# Altium footprint library IC.Pcblib: 91 footprints (part 5 of 6)
Each footprint in its own frame and in the unit in brackets; x right, y up, seen from the top. Pads: shape width x height; smd on the part's side, far side on the other; paste and mask are expansions set on the pad; w line width, h text height; cw(c..) or ccw(c..) is an arc to the next point about the centre after c.
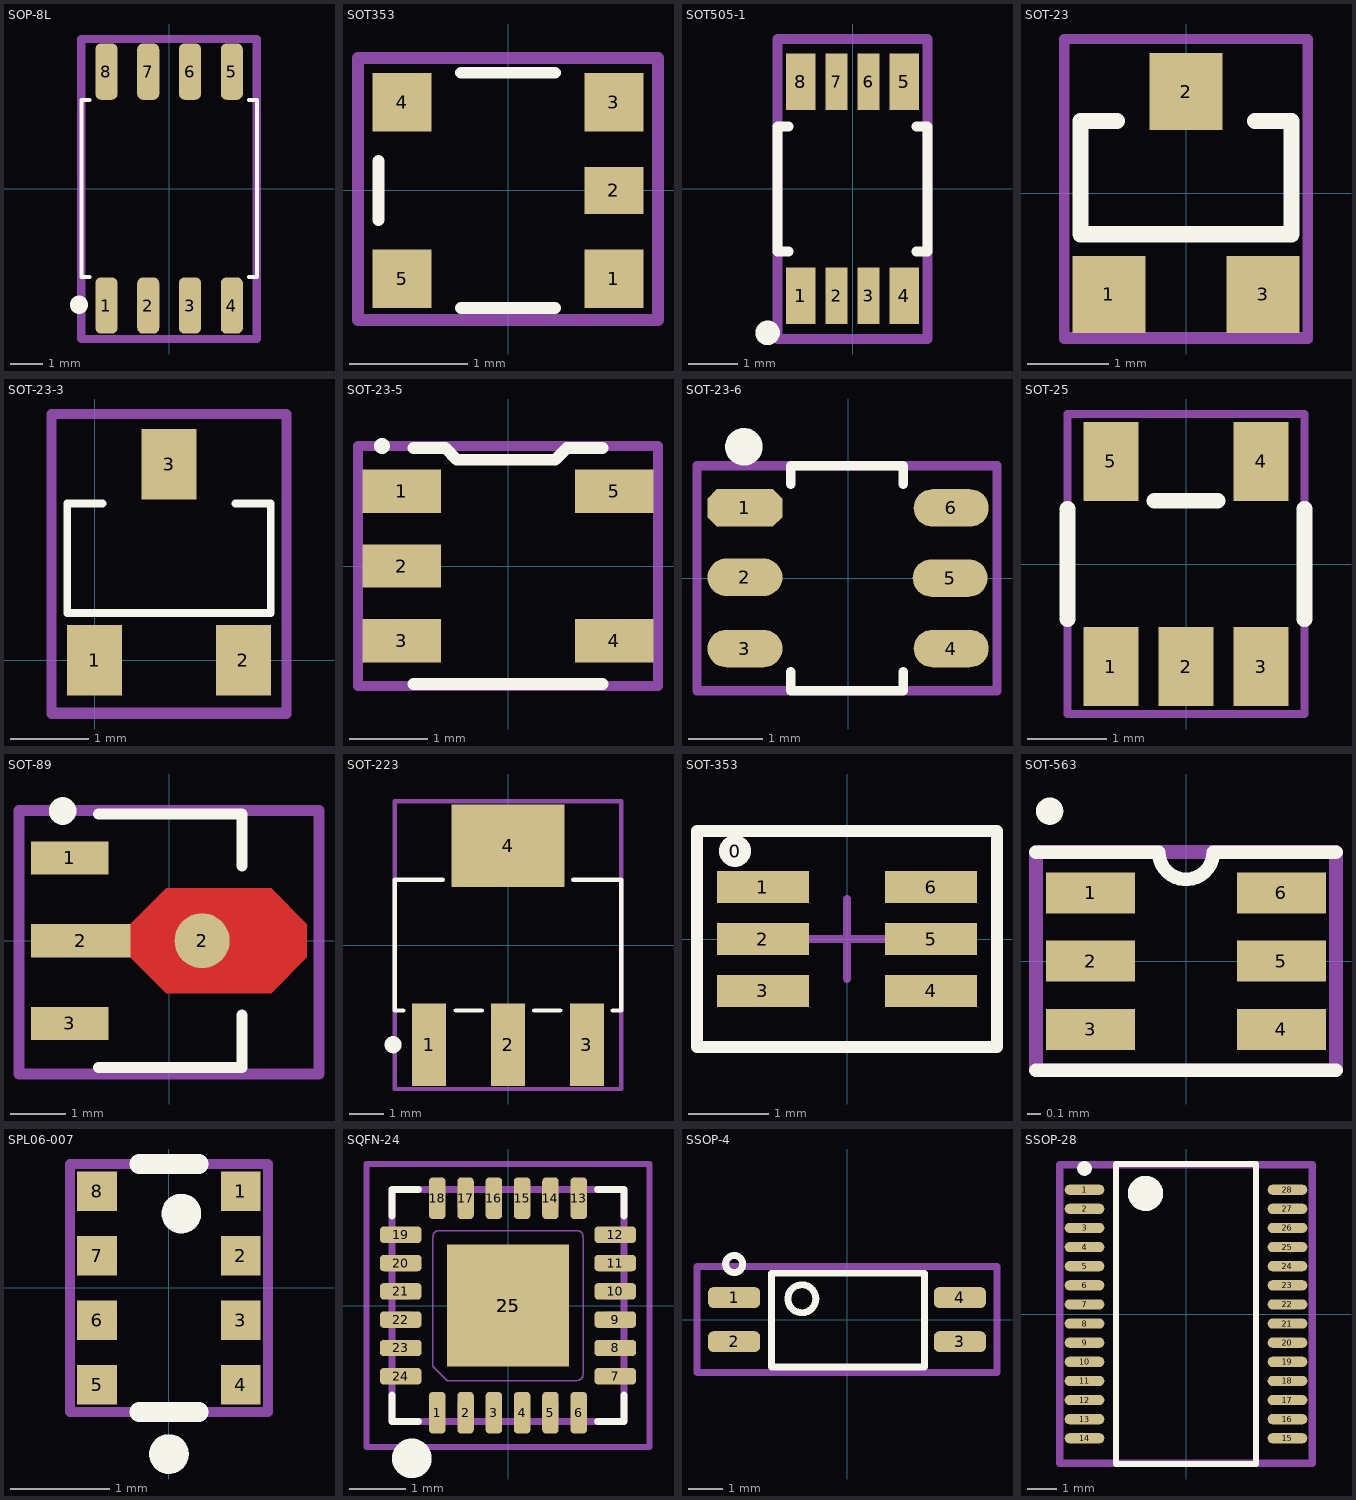
[diagram p4: the footprints below, top view; thin cyan lines are the x and y axes]

## SOP-8L [mm] "Small Outline IC (SOIC), 1.27 mm pitch; 8 pin, 5.23 mm L X 5.28 mm W X 2.16 mm H body"
height 2.16
pads (8):
  rrect51% 0.67x1.71 smd: 1(-1.905,-3.555) 2(-0.635,-3.555) 3(0.635,-3.555) 4(1.905,-3.555) 5(1.905,3.555) 6(0.635,3.555) 7(-0.635,3.555) 8(-1.905,3.555)
Top Overlay:
  circle w0.5: c-2.743,-3.531 r0.025
  lines w0.12: -2.42,-2.69 -2.67,-2.69 -2.67,2.69 -2.42,2.69 ; 2.42,-2.69 2.67,-2.69 2.67,2.69 2.42,2.69
Mechanical 13:
  lines w0.254: -2.667,-4.572 -2.667,4.547 2.667,4.547 2.667,-4.572 -2.667,-4.572
  text ".Designator" at 0.33,-4.572 h2
Mechanical 15:
  lines w0.254: -2.667,-4.572 -2.667,4.547 2.667,4.547 2.667,-4.572 -2.667,-4.572
  text ".Comment" at 0.33,-4.674 h2
3D body "SOIC8P127_523X790X216L65X43.STEP": height 2.16, standoff 0, extent -2.615,-3.95 2.615,3.95

## SOT353 [mm]
pads (5):
  rect 0.5x0.5 smd: 1(0.9,-0.75) 3(0.9,0.75) 4(-0.9,0.75) 5(-0.9,-0.75)
  rect 0.5x0.4 smd: 2(0.9,0)
Top Overlay:
  lines w0.1: -1.1,-0.25 -1.1,0.25 ; -0.4,-1 0.4,-1 ; -0.4,1 0.4,1
Mechanical 13:
  lines w0.1: -1.275,-1.1 -1.275,1.125 1.275,1.125 1.275,-1.1 -1.275,-1.1
  text ".Designator" at -0.5,-0.25 h1
3D body "82402374.stp": height 0.95, standoff -0.05, extent -1.1,-1 1.1,1

## SOT505-1 [mm] "TSOP, 8-Leads, Body 3.00x4.40mm, Pitch 0.65mm, IPC Medium Density"
height 1.2
pads (8):
  rect 0.6x1.15 smd: 1(-1.05,-2.175) 4(1.05,-2.175) 5(1.05,2.175) 8(-1.05,2.175)
  rect 0.45x1.15 smd: 2(-0.325,-2.175) 3(0.325,-2.175) 6(0.325,2.175) 7(-0.325,2.175)
Top Overlay:
  circle w0.25: c-1.725,-2.925 r0.125
  lines w0.2: -1.295,-1.27 -1.524,-1.27 -1.524,1.27 -1.295,1.27 ; 1.295,-1.27 1.524,-1.27 1.524,1.27 1.295,1.27
Mechanical 13:
  lines w0.2: -1.524,-3.048 1.524,-3.048 1.524,3.048 -1.524,3.048 -1.524,-3.048
  text ".Designator" at 0.356,-0.787 h1.5
Mechanical 15:
  lines w0.2: -1.524,-3.048 -1.524,3.048 1.524,3.048 1.524,-3.048 -1.524,-3.048
  text ".Comment" at 0.356,-0.787 h1.5

## SOT-23 [mm]
height 1.1
pads (3):
  rect 0.9x0.95 smd: 1(-0.95,-1.25) 2(0,1.25) 3(0.95,-1.25)
Top Overlay:
  lines w0.2: -0.85,0.889 -1.3,0.889 -1.3,-0.508 1.3,-0.508 1.3,0.889 0.85,0.889
Mechanical 13:
  lines w0.127: -1.5,-1.778 1.5,-1.778 1.5,1.9 -1.5,1.9 -1.5,-1.778
  text ".Designator" at 0.2,-1.6 h1
Mechanical 15:
  lines w0.127: -1.5,-1.8 1.5,-1.8 1.5,1.9 -1.5,1.9 -1.5,-1.8
  text ".Comment" at 0.254,-1.651 h1
3D body "SW3DPS-SOT-23-DEFAULT.STEP": height 1.06, standoff -0.04, extent -1.5,-1.123 1.5,1.377

## SOT-23-3 [mm]
pads (3):
  rect 0.7x0.9 smd: 1(0,0) 2(1.9,0) 3(0.95,2.5)
Top Overlay:
  lines w0.1: 0.1,2 -0.35,2 -0.35,0.603 2.25,0.603 2.25,2 1.8,2
Mechanical 13:
  lines w0.127: -0.55,-0.667 -0.55,3.143 2.45,3.143 2.45,-0.667 -0.55,-0.667
  text ".Designator" at 1.204,-0.54 h1
Mechanical 15:
  lines w0.127: -0.55,-0.689 -0.55,3.143 2.45,3.143 2.45,-0.689 -0.55,-0.689
  text ".Comment" at 1.204,-0.54 h1
3D body "SW3DPS-SOT-23-DEFAULT.STEP": height 1.06, standoff -0.04, extent -0.55,-0.012 2.45,2.488

## SOT-23-5 [mm] "SOT-23-5"
height 1.1
pads (5):
  rect 1x0.55 smd: 1(-1.35,0.95) 2(-1.35,0) 3(-1.35,-0.95) 4(1.35,-0.95) 5(1.35,0.95)
Top Overlay:
  circle w0.1: c-1.6,1.524 r0.051
  lines w0.15: -1.2,-1.5 1.2,-1.5 ; -1.2,1.5 -0.8,1.5 -0.65,1.35 0.6,1.35 0.75,1.5 1.2,1.5
Mechanical 13:
  lines w0.127: -1.905,-1.524 -1.905,1.524 1.905,1.524 1.905,-1.524 -1.905,-1.524
  text ".Designator" at -1.778,-0.381 h1
Mechanical 15:
  lines w0.127: -1.905,-1.524 1.905,-1.524 1.905,1.524 -1.905,1.524 -1.905,-1.524
  text ".Comment" at -1.651,-0.381 h1
3D body "SOT23_5.stp": height 0.92, standoff 0.01, extent -1.603,-1.5 1.602,1.5

## SOT-23-6 [mil]
pads (6):
  oct 40x20 smd: 1(-55,37.5)
  oval 40x20 smd: 2(-55,0.5) 3(-55,-37.5) 4(55,-37.5) 5(54.41,0.1) 6(55,37.5)
Top Overlay:
  circle w10: c-55.59,70.1 r5
  lines w5: -30.59,-49.9 -30.59,-59.9 29.41,-59.9 29.41,-49.9 ; -30.59,50.1 -30.59,60.1 29.41,60.1 29.41,50.1
Mechanical 13:
  lines w5: -80.59,-59.9 -80.59,60.1 79.41,60.1 79.41,-59.9 -80.59,-59.9
  text ".Designator" at -75,-5 h39.37
3D body "User Library-SOT23-6.step": height 51.18, standoff 0, extent -59.64,-58.95 58.47,59.16

## SOT-25 [mm]
pads (5):
  rect 0.7x1 smd: 1(-0.95,-1.3) 2(0,-1.3) 3(0.95,-1.3) 4(0.95,1.3) 5(-0.95,1.3)
Top Overlay:
  lines w0.2: -1.5,-0.7 -1.5,0.7 ; -0.4,0.8 0.4,0.8 ; 1.5,-0.7 1.5,0.7
Mechanical 13:
  lines w0.1: -1.5,-1.9 1.5,-1.9 1.5,1.9 -1.5,1.9 -1.5,-1.9
  text ".Designator" at 0.1,-1.7 h0.8
Mechanical 15:
  lines w0.1: -1.5,-1.9 -1.5,1.9 1.5,1.9 1.5,-1.9 -1.5,-1.9
  text ".Comment" at 0.1,-1.7 h0.8
3D body "User Library-sot25.step": height 1.1, standoff -0.05, extent -1.5,-1.2 1.5,1.2

## SOT-89 [mm] "SOT89, 3-Leads, Body 4.55x2.55mm, Pitch 1.50mm, Lead Span 4.1mm, IPC Medium Density"
height 1.5
pads (4):
  rect 1.4x0.6 smd: 1(-1.8,1.5) 3(-1.8,-1.5)
  rect 1.8x0.6 smd: 2(-1.6,0)
  round 1 smd: 2(0.6,0)
Top Layer:
  region: -0.7,0.3 -0.05,0.95 1.85,0.95 2.5,0.3 2.5,-0.3 1.85,-0.95 -0.05,-0.95 -0.7,-0.3
Top Overlay:
  circle w0.25: c-1.927,2.35 r0.125
  lines w0.2: -1.278,-2.3 1.322,-2.3 1.322,-1.35 ; -1.278,2.3 1.322,2.3 1.322,1.35
Mechanical 13:
  lines w0.2: -2.718,-2.413 2.718,-2.413 2.718,2.362 -2.718,2.362 -2.718,-2.413
  text ".Designator" at -2.718,-0.572 h2
3D body "CircuitWorks-SOT89.step": height 1.5, standoff 0, extent -2.077,-2.25 1.923,2.25

## SOT-223 [mm]
pads (4):
  rect 1x2.4 smd: 1(-2.3,-2.9) 2(0,-2.9) 3(2.3,-2.9)
  rect 3.3x2.4 smd: 4(0,2.9)
Top Overlay:
  circle w0.25: c-3.35,-2.9 r0.125
  lines w0.127: -3.048,-1.905 -3.302,-1.905 -3.302,1.905 -1.905,1.905 ; -1.524,-1.905 -0.762,-1.905 ; 0.762,-1.905 1.524,-1.905 ; 1.905,1.905 3.302,1.905 3.302,-1.651 3.302,-1.905 3.048,-1.905
Mechanical 13:
  lines w0.127: -3.302,-4.191 -3.302,4.191 3.302,4.191 3.302,-4.191 -3.302,-4.191
  text ".Designator" at -2.286,-0.635 h1
Mechanical 15:
  lines w0.127: -3.302,-4.191 -3.302,4.191 3.302,4.191 3.302,-4.191 -3.302,-4.191
  text ".Comment" at -2.286,-0.635 h1
3D body "SW3DPS-SOT-223-DEFAULT.step": height 1.68, standoff 0, extent -3.25,-3.556 3.25,3.404

## SOT-353 [mm]
pads (7):
  round 0.4 on Top Overlay: 0(-1.4,1.1)
  rect 1.15x0.4 smd: 1(-1.05,0.65) 2(-1.05,0) 3(-1.05,-0.65) 4(1.05,-0.65) 5(1.05,0) 6(1.05,0.65)
Top Overlay:
  lines w0.15: -1.875,-1.35 -1.875,1.35 1.875,1.35 1.875,-1.35 -1.875,-1.35
Mechanical 15:
  lines w0.05: -1.875,-1.35 -1.875,1.35 1.875,1.35 1.875,-1.35 -1.875,-1.35
  lines w0.1: -0.5,0 0.5,0 ; 0,-0.5 0,0.5
3D body "User Library-SOT-363.step": height 1, standoff -0.05, extent -1.131,-1 1.131,1

## SOT-563 [mm]
pads (6):
  rect 0.65x0.3 smd: 1(-0.7,0.5) 2(-0.7,0) 3(-0.7,-0.5) 4(0.7,-0.5) 5(0.7,0) 6(0.7,0.5)
Top Overlay:
  circle w0.1: c-1,1.1 r0.05
  lines w0.1: -1.1,-0.8 1.1,-0.8 ; -1.1,0.8 -0.2,0.8 ccw(c0,0.8) 0.2,0.8 1.1,0.8
Mechanical 13:
  lines w0.1: -1.1,-0.8 1.1,-0.8 1.1,0.8 -1.1,0.8 -1.1,-0.8
  text ".Designator" at -0.8,-0.3 h1
Mechanical 15:
  lines w0.1: -1.1,-0.8 -1.1,0.8 1.1,0.8 1.1,-0.8 -1.1,-0.8
  text ".Value" at -0.7,-0.1 h0.5
3D body: height 0.6, standoff 0, extent -0.65,-0.8 0.65,0.8

## SPL06-007 [mm]
pads (8):
  rect 0.4x0.4 smd: 1(0.725,0.975) 2(0.725,0.325) 3(0.725,-0.325) 4(0.725,-0.975) 5(-0.725,-0.975) 6(-0.725,-0.325) 7(-0.725,0.325) 8(-0.725,0.975)
Top Overlay:
  circle w0.2: c0,-1.675 r0.1
  circle w0.2: c0.125,0.75 r0.1
  lines w0.2: -0.3,-1.25 0.3,-1.25 ; -0.3,1.25 0.3,1.25
Mechanical 13:
  lines w0.1: -1,-1.25 1,-1.25 1,1.25 -1,1.25 -1,-1.25
  text ".Designator" at -0.725,-0.325 h1
3D body "User Library-BMP280.STEP": height 0.95, standoff -0.01, extent -1,-1.25 1,1.25

## SQFN-24 [mm] "Quad Flat No-Lead (QFN with Tab), 0.50 mm pitch; square, 6 pin X 6 pin, 4.00 mm L X 4.00 mm W X 0.55 mm H body"
height 0.55
pads (26):
  rrect48% 0.29x0.74 smd: 1(-1.25,-1.895) 2(-0.75,-1.895) 3(-0.25,-1.895) 4(0.25,-1.895) 5(0.75,-1.895) 6(1.25,-1.895) 13(1.25,1.895) 14(0.75,1.895) 15(0.25,1.895) 16(-0.25,1.895) 17(-0.75,1.895) 18(-1.25,1.895)
  rrect48% 0.74x0.29 smd: 7(1.895,-1.25) 8(1.895,-0.75) 9(1.895,-0.25) 10(1.895,0.25) 11(1.895,0.75) 12(1.895,1.25) 19(-1.895,1.25) 20(-1.895,0.75) 21(-1.895,0.25) 22(-1.895,-0.25) 23(-1.895,-0.75) 24(-1.895,-1.25)
  rect 2.15x2.15 smd paste-2.15 mask-2.15: 25(0,0)
  rect 2.15x2.15 on Top Solder paste-2.15 mask-2.15: 25(0,0)
Top Overlay:
  circle w0.5: c-1.7,-2.7 r0.1
  lines w0.12: -2.05,-1.58 -2.05,-2.05 -1.58,-2.05 ; -2.05,1.58 -2.05,2.05 -1.58,2.05 ; 1.58,-2.05 2.05,-2.05 2.05,-1.58 ; 1.58,2.05 2.05,2.05 2.05,1.58
Top Paste:
  region: 1.135,-1.135 0.195,-1.135 0.195,-0.195 1.135,-0.195
  region: -0.195,-1.135 -1.135,-1.135 -1.135,-0.195 -0.195,-0.195
  region: -0.195,0.195 -1.135,0.195 -1.135,1.135 -0.195,1.135
  region: 1.135,0.195 0.195,0.195 0.195,1.135 1.135,1.135
Mechanical 11:
  lines w0.12: -2.05,-2.05 2.05,-2.05 2.05,2.05 -2.05,2.05 -2.05,-2.05
Mechanical 12:
  lines w0.025: -2,-2 2,-2 2,2 -2,2 -2,-2 ; -2,-1.378 -2,-1.122 -1.727,-1.122 cw(c-1.727,-1.25) -1.727,-1.378 -2,-1.378 ; -2,-0.877 -2,-0.623 -1.727,-0.623 cw(c-1.727,-0.75) -1.727,-0.878 -2,-0.877 ; -2,-0.377 -2,-0.122 -1.727,-0.122 cw(c-1.727,-0.25) -1.727,-0.377 -2,-0.377 ; -2,0.122 -2,0.377 -1.727,0.377 cw(c-1.727,0.25) -1.727,0.122 -2,0.122 ; -2,0.623 -2,0.877 -1.727,0.877 cw(c-1.727,0.75) -1.727,0.623 -2,0.623 ; -2,1.122 -2,1.378 -1.727,1.378 cw(c-1.727,1.25) -1.727,1.122 -2,1.122 ; -1.378,-2 -1.122,-2 -1.122,-1.727 ccw(c-1.25,-1.727) -1.378,-1.727 -1.378,-2 ; -1.378,1.727 ccw(c-1.25,1.727) -1.122,1.727 -1.122,2 -1.378,2 -1.378,1.727 ; -1.325,-1.075 -1.075,-1.325 1.225,-1.325 ccw(c1.225,-1.225) 1.325,-1.225 1.325,1.225 ccw(c1.225,1.225) 1.225,1.325 -1.225,1.325 ccw(c-1.225,1.225) -1.325,1.225 -1.325,-1.075 ; -0.877,-2 -0.623,-2 -0.623,-1.727 ccw(c-0.75,-1.727) -0.878,-1.727 -0.877,-2 ; -0.878,1.727 ccw(c-0.75,1.727) -0.623,1.727 -0.623,2 -0.877,2 -0.877,1.727 ; -0.377,-2 -0.122,-2 -0.122,-1.727 ccw(c-0.25,-1.727) -0.377,-1.727 -0.377,-2 ; -0.377,1.727 ccw(c-0.25,1.727) -0.122,1.727 -0.122,2 -0.377,2 -0.377,1.727 ; 0.122,-2 0.377,-2 0.377,-1.727 ccw(c0.25,-1.727) 0.122,-1.727 0.122,-2 ; 0.122,1.727 ccw(c0.25,1.727) 0.377,1.727 0.377,2 0.122,2 0.122,1.727 ; 0.623,-2 0.877,-2 0.877,-1.727 ccw(c0.75,-1.727) 0.623,-1.727 0.623,-2 ; 0.623,1.727 ccw(c0.75,1.727) 0.878,1.727 0.877,2 0.623,2 0.623,1.727 ; 1.122,-2 1.378,-2 1.378,-1.727 ccw(c1.25,-1.727) 1.122,-1.727 1.122,-2 ; 1.122,1.727 ccw(c1.25,1.727) 1.378,1.727 1.378,2 1.122,2 1.122,1.727 ; 1.727,-1.378 cw(c1.727,-1.25) 1.727,-1.122 2,-1.122 2,-1.378 1.727,-1.378 ; 1.727,-0.878 cw(c1.727,-0.75) 1.727,-0.623 2,-0.623 2,-0.877 1.727,-0.877 ; 1.727,-0.377 cw(c1.727,-0.25) 1.727,-0.122 2,-0.122 2,-0.377 1.727,-0.377 ; 1.727,0.122 cw(c1.727,0.25) 1.727,0.377 2,0.377 2,0.122 1.727,0.122 ; 1.727,0.623 cw(c1.727,0.75) 1.727,0.878 2,0.877 2,0.623 1.727,0.623 ; 1.727,1.122 cw(c1.727,1.25) 1.727,1.378 2,1.378 2,1.122 1.727,1.122
Mechanical 13:
  lines w0.1: -2.5,-2.5 -2.5,2.5 2.5,2.5 2.5,-2.5 -2.5,-2.5
  text ".Designator" at -1.9,-0.2 h0.8
Mechanical 15:
  lines w0.1: -2.5,-2.5 2.5,-2.5 2.5,2.5 -2.5,2.5 -2.5,-2.5
  text ".Comment" at -1.9,-0.2 h0.8
3D body "SQFN-24.STEP": height 0.55, standoff 0, extent -2.05,-2.05 2.05,2.05

## SSOP-4 [mm]
pads (4):
  rrect52% 1.5x0.6 smd: 1(-3.25,0.635) 2(-3.25,-0.635) 3(3.25,-0.635) 4(3.25,0.635)
Top Overlay:
  circle w0.2: c-1.3,0.6 r0.403
  circle w0.2: c-3.25,1.6 r0.246
  lines w0.2: -2.175,-1.366 -2.175,1.334 2.225,1.334 2.225,-1.366 -2.175,-1.366
Mechanical 13:
  lines w0.2: -4.318,-1.524 -4.318,1.524 4.318,1.524 4.318,-1.524 -4.318,-1.524
  text ".Designator" at -3.556,-0.508 h1.5
3D body "User Library-SSOP-4.step": height 2, standoff -0.02, extent -3.475,-1.35 3.525,1.35

## SSOP-28 [mm] "TSSOP, 28-Leads, Body 10.20x5.30mm, Pitch 0.65mm, IPC High Density"
height 1.2
pads (28):
  oval 1.35x0.35 smd: 1(-3.45,4.225) 2(-3.45,3.575) 3(-3.45,2.925) 4(-3.45,2.275) 5(-3.45,1.625) 6(-3.45,0.975) 7(-3.45,0.325) 8(-3.45,-0.325) 9(-3.45,-0.975) 10(-3.45,-1.625) 11(-3.45,-2.275) 12(-3.45,-2.925) 13(-3.45,-3.575) 14(-3.45,-4.225) 15(3.45,-4.225) 16(3.45,-3.575) 17(3.45,-2.925) 18(3.45,-2.275) 19(3.45,-1.625) 20(3.45,-0.975) 21(3.45,-0.325) 22(3.45,0.325) 23(3.45,0.975) 24(3.45,1.625) 25(3.45,2.275) 26(3.45,2.925) 27(3.45,3.575) 28(3.45,4.225)
Top Overlay:
  circle w0.6: c-1.375,4.1 r0.3
  circle w0.25: c-3.45,4.95 r0.125
  lines w0.2: -2.375,-5.1 2.375,-5.1 2.375,5.1 -2.375,5.1 -2.375,-5.1
Mechanical 13:
  lines w0.254: -4.293,-5.08 4.293,-5.08 4.293,5.08 -4.293,5.08 -4.293,-5.08
  text ".Designator" at -0.279,4.75 h2
Mechanical 15:
  lines w0.254: -4.293,-5.08 4.293,-5.08 4.293,5.029 4.242,5.08 -4.293,5.08 -4.293,-5.08
  text ".Comment" at -0.305,4.75 h2
3D body "SOP65P770x200-28N.step": height 2.15, standoff 0, extent -3.878,-5.165 3.878,5.165